# Altium footprint library WR-TBL_Pluggable PCB Header.PcbLib: 719 footprints (part 28 of 45)
Each footprint in its own frame and in the unit in brackets; x right, y up, seen from the top. Pads: shape width x height; smd on the part's side, far side on the other; paste and mask are expansions set on the pad; w line width, h text height; cw(c..) or ccw(c..) is an arc to the next point about the centre after c.
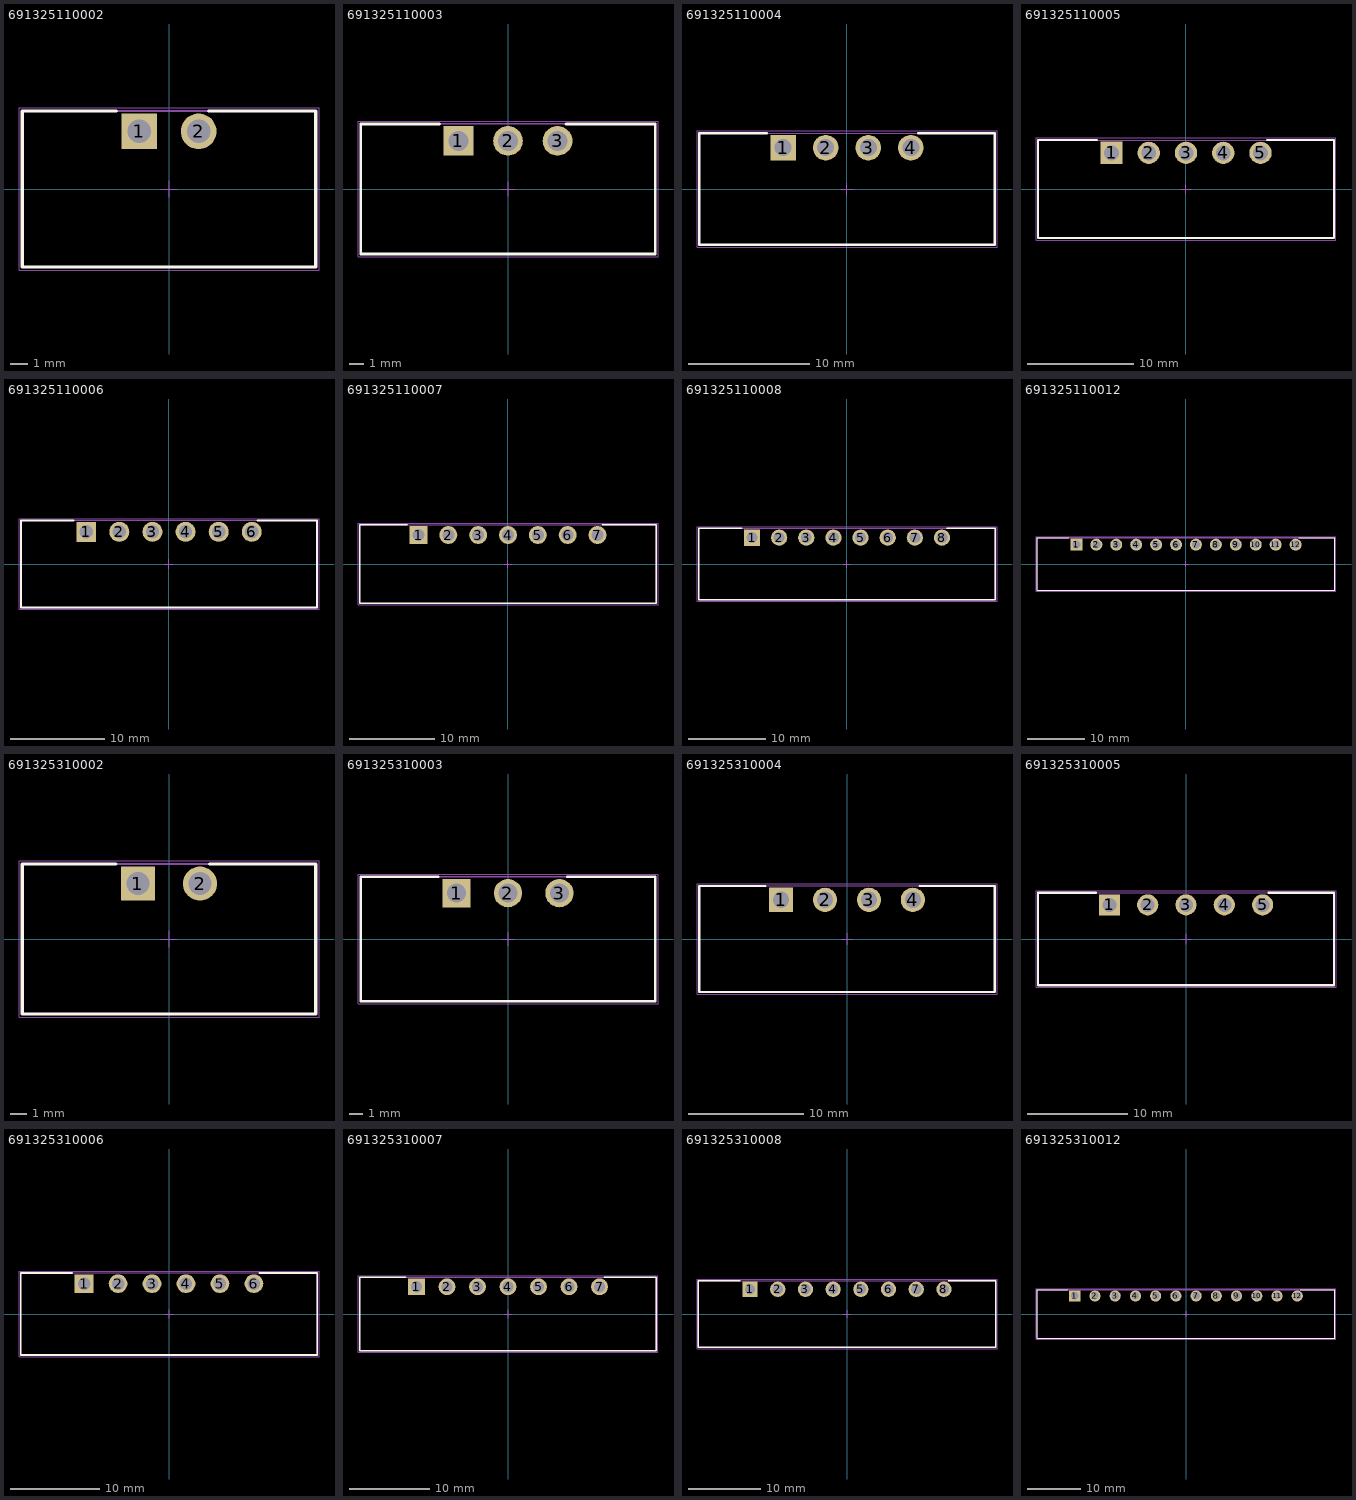
[diagram p27: the footprints below, top view; thin cyan lines are the x and y axes]

## 691325110002 [mm] "Horizontal PCB Header with Flanges, pitch 3.5mm, 02p"
height 7.2
pads (2):
  rect 2.1x2.1 hole 1.4: 1(-1.75,3.4)
  round 2.1 hole 1.4: 2(1.75,3.4)
Top Overlay:
  lines w0.2: -3.1,4.6 -8.65,4.6 -8.65,-4.6 8.65,-4.6 8.65,4.6 2.35,4.6
Mechanical 13:
  lines w0.1: -8.65,-4.6 -8.65,4.6 8.65,4.6 8.65,-4.6 -8.65,-4.6
Mechanical 15:
  lines w0.05: -0.5,0 0.5,0 ; 0,-0.5 0,0.5 ; -8.85,-4.8 8.85,-4.8 8.85,4.8 -8.85,4.8 -8.85,-4.8
3D body "691325110002.stp": height 7.3, standoff -3.5, extent -8.65,-4.6 8.65,4.6

## 691325110003 [mm] "Horizontal PCB Header with Flanges, pitch 3.5mm, 03p"
height 7.2
pads (3):
  rect 2.1x2.1 hole 1.4: 1(-3.5,3.4)
  round 2.1 hole 1.4: 2(0,3.4) 3(3.5,3.4)
Top Overlay:
  lines w0.2: -4.85,4.6 -10.4,4.6 -10.4,-4.6 10.4,-4.6 10.4,4.6 4.1,4.6
Mechanical 13:
  lines w0.1: -10.4,-4.6 -10.4,4.6 10.4,4.6 10.4,-4.6 -10.4,-4.6
Mechanical 15:
  lines w0.05: -0.5,0 0.5,0 ; 0,-0.5 0,0.5 ; -10.6,-4.8 10.6,-4.8 10.6,4.8 -10.6,4.8 -10.6,-4.8
3D body "691325110003.stp": height 7.3, standoff -3.5, extent -10.4,-4.6 10.4,4.6

## 691325110004 [mm] "Horizontal PCB Header with Flanges, pitch 3.5mm, 04p"
height 7.2
pads (4):
  rect 2.1x2.1 hole 1.4: 1(-5.25,3.4)
  round 2.1 hole 1.4: 2(-1.75,3.4) 3(1.75,3.4) 4(5.25,3.4)
Top Overlay:
  lines w0.2: -6.6,4.6 -12.15,4.6 -12.15,-4.6 12.15,-4.6 12.15,4.6 5.85,4.6
Mechanical 13:
  lines w0.1: -12.15,-4.6 -12.15,4.6 12.15,4.6 12.15,-4.6 -12.15,-4.6
Mechanical 15:
  lines w0.05: -0.5,0 0.5,0 ; 0,-0.5 0,0.5 ; -12.35,-4.8 12.35,-4.8 12.35,4.8 -12.35,4.8 -12.35,-4.8
3D body "691325110004.stp": height 7.3, standoff -3.5, extent -12.15,-4.6 12.15,4.6

## 691325110005 [mm] "Horizontal PCB Header with Flanges, pitch 3.5mm, 05p"
height 7.2
pads (5):
  rect 2.1x2.1 hole 1.4: 1(-7,3.4)
  round 2.1 hole 1.4: 2(-3.5,3.4) 3(0,3.4) 4(3.5,3.4) 5(7,3.4)
Top Overlay:
  lines w0.2: -8.35,4.6 -13.9,4.6 -13.9,-4.6 13.9,-4.6 13.9,4.6 7.6,4.6
Mechanical 13:
  lines w0.1: -13.9,-4.6 -13.9,4.6 13.9,4.6 13.9,-4.6 -13.9,-4.6
Mechanical 15:
  lines w0.05: -0.5,0 0.5,0 ; 0,-0.5 0,0.5 ; -14.1,-4.8 14.1,-4.8 14.1,4.8 -14.1,4.8 -14.1,-4.8
3D body "691325110005.stp": height 7.3, standoff -3.5, extent -13.9,-4.6 13.9,4.6

## 691325110006 [mm] "Horizontal PCB Header with Flanges, pitch 3.5mm, 06p"
height 7.2
pads (6):
  rect 2.1x2.1 hole 1.4: 1(-8.75,3.4)
  round 2.1 hole 1.4: 2(-5.25,3.4) 3(-1.75,3.4) 4(1.75,3.4) 5(5.25,3.4) 6(8.75,3.4)
Top Overlay:
  lines w0.2: -10.1,4.6 -15.65,4.6 -15.65,-4.6 15.65,-4.6 15.65,4.6 9.35,4.6
Mechanical 13:
  lines w0.1: -15.65,-4.6 15.65,-4.6 15.65,4.6 -15.65,4.6 -15.65,-4.6
Mechanical 15:
  lines w0.05: -0.5,0 0.5,0 ; 0,-0.5 0,0.5 ; -15.85,-4.8 -15.85,4.8 15.85,4.8 15.85,-4.8 -15.85,-4.8
3D body "691325110006.stp": height 7.3, standoff -3.5, extent -15.65,-4.6 15.65,4.6

## 691325110007 [mm] "Horizontal PCB Header with Flanges, pitch 3.5mm, 07p"
height 7.2
pads (7):
  rect 2.1x2.1 hole 1.4: 1(-10.5,3.4)
  round 2.1 hole 1.4: 2(-7,3.4) 3(-3.5,3.4) 4(0,3.4) 5(3.5,3.4) 6(7,3.4) 7(10.5,3.4)
Top Overlay:
  lines w0.2: -11.85,4.6 -17.4,4.6 -17.4,-4.6 17.4,-4.6 17.4,4.6 11.1,4.6
Mechanical 13:
  lines w0.1: -17.4,-4.6 17.4,-4.6 17.4,4.6 -17.4,4.6 -17.4,-4.6
Mechanical 15:
  lines w0.05: -0.5,0 0.5,0 ; 0,-0.5 0,0.5 ; -17.6,-4.8 -17.6,4.8 17.6,4.8 17.6,-4.8 -17.6,-4.8
3D body "691325110007.stp": height 7.3, standoff -3.4, extent -17.4,-4.6 17.4,4.6

## 691325110008 [mm] "Horizontal PCB Header with Flanges, pitch 3.5mm, 08p"
height 7.2
pads (8):
  rect 2.1x2.1 hole 1.4: 1(-12.25,3.4)
  round 2.1 hole 1.4: 2(-8.75,3.4) 3(-5.25,3.4) 4(-1.75,3.4) 5(1.75,3.4) 6(5.25,3.4) 7(8.75,3.4) 8(12.25,3.4)
Top Overlay:
  lines w0.2: -13.6,4.6 -19.15,4.6 -19.15,-4.6 19.15,-4.6 19.15,4.6 12.85,4.6
Mechanical 13:
  lines w0.1: -19.15,-4.6 -19.15,4.6 19.15,4.6 19.15,-4.6 -19.15,-4.6
Mechanical 15:
  lines w0.05: -0.5,0 0.5,0 ; 0,-0.5 0,0.5 ; -19.35,-4.8 19.35,-4.8 19.35,4.8 -19.35,4.8 -19.35,-4.8
3D body "691325110008.stp": height 7.3, standoff -3.4, extent -19.15,-4.6 19.15,4.6

## 691325110012 [mm] "Horizontal PCB Header with Flanges, pitch 3.5mm, 12p"
height 7.2
pads (12):
  rect 2.1x2.1 hole 1.4: 1(-19.25,3.4)
  round 2.1 hole 1.4: 2(-15.75,3.4) 3(-12.25,3.4) 4(-8.75,3.4) 5(-5.25,3.4) 6(-1.75,3.4) 7(1.75,3.4) 8(5.25,3.4) 9(8.75,3.4) 10(12.25,3.4) 11(15.75,3.4) 12(19.25,3.4)
Top Overlay:
  lines w0.2: -20.6,4.6 -26.15,4.6 -26.15,-4.6 26.15,-4.6 26.15,4.6 19.85,4.6
Mechanical 13:
  lines w0.1: -26.15,-4.6 -26.15,4.6 26.15,4.6 26.15,-4.6 -26.15,-4.6
Mechanical 15:
  lines w0.05: -0.5,0 0.5,0 ; 0,-0.5 0,0.5 ; -26.35,-4.8 26.35,-4.8 26.35,4.8 -26.35,4.8 -26.35,-4.8
3D body "691325110012.stp": height 7.3, standoff -3.4, extent -26.15,-4.6 26.15,4.6

## 691325310002 [mm] "Horizontal PCB Header with Flanges, pitch 3.81mm, 02p"
height 7
pads (2):
  rect 2.1x2.1 hole 1.4: 1(-1.905,3.4)
  round 2.1 hole 1.4: 2(1.905,3.4)
Top Overlay:
  lines w0.2: -3.255,4.6 -9.005,4.6 -9.005,-4.6 9.005,-4.6 9.005,4.6 2.495,4.6
Mechanical 13:
  lines w0.1: -9.005,-4.6 -9.005,4.6 9.005,4.6 9.005,-4.6 -9.005,-4.6
Mechanical 15:
  lines w0.05: -0.5,0 0.5,0 ; 0,-0.5 0,0.5 ; -9.205,-4.8 9.205,-4.8 9.205,4.8 -9.205,4.8 -9.205,-4.8
3D body "691325310002.stp": height 7.3, standoff -3.4, extent -9.005,-4.6 9.005,4.6

## 691325310003 [mm] "Horizontal PCB Header with Flanges, pitch 3.81mm, 03p"
height 7
pads (3):
  rect 2.1x2.1 hole 1.4: 1(-3.81,3.4)
  round 2.1 hole 1.4: 2(0,3.4) 3(3.81,3.4)
Top Overlay:
  lines w0.2: -5.16,4.6 -10.91,4.6 -10.91,-4.6 10.91,-4.6 10.91,4.6 4.4,4.6
Mechanical 13:
  lines w0.1: -10.91,-4.6 -10.91,4.6 10.91,4.6 10.91,-4.6 -10.91,-4.6
Mechanical 15:
  lines w0.05: -0.5,0 0.5,0 ; 0,-0.5 0,0.5 ; -11.11,-4.8 11.11,-4.8 11.11,4.8 -11.11,4.8 -11.11,-4.8
3D body "691325310003.stp": height 7.3, standoff -3.4, extent -10.91,-4.6 10.91,4.6

## 691325310004 [mm] "Horizontal PCB Header with Flanges, pitch 3.81mm, 04p"
height 7
pads (4):
  rect 2.1x2.1 hole 1.4: 1(-5.715,3.4)
  round 2.1 hole 1.4: 2(-1.905,3.4) 3(1.905,3.4) 4(5.715,3.4)
Top Overlay:
  lines w0.2: -7.065,4.6 -12.815,4.6 -12.815,-4.6 12.815,-4.6 12.815,4.6 6.305,4.6
Mechanical 13:
  lines w0.1: -12.815,-4.6 -12.815,4.6 12.815,4.6 12.815,-4.6 -12.815,-4.6
Mechanical 15:
  lines w0.05: -0.5,0 0.5,0 ; 0,-0.5 0,0.5 ; -13.015,-4.8 13.015,-4.8 13.015,4.8 -13.015,4.8 -13.015,-4.8
3D body "691325310004.stp": height 7.3, standoff -3.4, extent -12.815,-4.6 12.815,4.6

## 691325310005 [mm] "Horizontal PCB Header with Flanges, pitch 3.81mm, 05p"
height 7
pads (5):
  rect 2.1x2.1 hole 1.4: 1(-7.62,3.4)
  round 2.1 hole 1.4: 2(-3.81,3.4) 3(0,3.4) 4(3.81,3.4) 5(7.62,3.4)
Top Overlay:
  lines w0.2: -8.97,4.6 -14.72,4.6 -14.72,-4.6 14.72,-4.6 14.72,4.6 8.21,4.6
Mechanical 13:
  lines w0.1: -14.72,-4.6 14.72,-4.6 14.72,4.6 -14.72,4.6 -14.72,-4.6
Mechanical 15:
  lines w0.05: -0.5,0 0.5,0 ; 0,-0.5 0,0.5 ; -14.92,-4.8 -14.92,4.8 14.92,4.8 14.92,-4.8 -14.92,-4.8
3D body "691325310005.stp": height 7.3, standoff -3.4, extent -14.72,-4.6 14.72,4.6

## 691325310006 [mm] "Horizontal PCB Header with Flanges, pitch 3.81mm, 06p"
height 7
pads (6):
  rect 2.1x2.1 hole 1.4: 1(-9.525,3.4)
  round 2.1 hole 1.4: 2(-5.715,3.4) 3(-1.905,3.4) 4(1.905,3.4) 5(5.715,3.4) 6(9.525,3.4)
Top Overlay:
  lines w0.2: -10.875,4.6 -16.625,4.6 -16.625,-4.6 16.625,-4.6 16.625,4.6 10.115,4.6
Mechanical 13:
  lines w0.1: -16.625,-4.6 16.625,-4.6 16.625,4.6 -16.625,4.6 -16.625,-4.6
Mechanical 15:
  lines w0.05: -0.5,0 0.5,0 ; 0,-0.5 0,0.5 ; -16.825,-4.8 -16.825,4.8 16.825,4.8 16.825,-4.8 -16.825,-4.8
3D body "691325310006.stp": height 7.3, standoff -3.4, extent -16.625,-4.6 16.625,4.6

## 691325310007 [mm] "Horizontal PCB Header with Flanges, pitch 3.81mm, 07p"
height 7
pads (7):
  rect 2.1x2.1 hole 1.4: 1(-11.43,3.4)
  round 2.1 hole 1.4: 2(-7.62,3.4) 3(-3.81,3.4) 4(0,3.4) 5(3.81,3.4) 6(7.62,3.4) 7(11.43,3.4)
Top Overlay:
  lines w0.2: -12.78,4.6 -18.53,4.6 -18.53,-4.6 18.53,-4.6 18.53,4.6 12.02,4.6
Mechanical 13:
  lines w0.1: -18.53,-4.6 18.53,-4.6 18.53,4.6 -18.53,4.6 -18.53,-4.6
Mechanical 15:
  lines w0.05: -0.5,0 0.5,0 ; 0,-0.5 0,0.5 ; -18.73,-4.8 -18.73,4.8 18.73,4.8 18.73,-4.8 -18.73,-4.8
3D body "691325310007.stp": height 7.3, standoff -3.4, extent -18.53,-4.6 18.53,4.6

## 691325310008 [mm] "Horizontal PCB Header with Flanges, pitch 3.81mm, 08p"
height 7
pads (8):
  rect 2.1x2.1 hole 1.4: 1(-13.335,3.4)
  round 2.1 hole 1.4: 2(-9.525,3.4) 3(-5.715,3.4) 4(-1.905,3.4) 5(1.905,3.4) 6(5.715,3.4) 7(9.525,3.4) 8(13.335,3.4)
Top Overlay:
  lines w0.2: -14.685,4.6 -20.435,4.6 -20.435,-4.6 20.435,-4.6 20.435,4.6 13.925,4.6
Mechanical 13:
  lines w0.1: -20.435,-4.6 20.435,-4.6 20.435,4.6 -20.435,4.6 -20.435,-4.6
Mechanical 15:
  lines w0.05: -0.5,0 0.5,0 ; 0,-0.5 0,0.5 ; -20.635,-4.8 -20.635,4.8 20.635,4.8 20.635,-4.8 -20.635,-4.8
3D body "691325310008.stp": height 7.3, standoff -3.4, extent -20.435,-4.6 20.435,4.6

## 691325310012 [mm] "Horizontal PCB Header with Flanges, pitch 3.81mm, 12p"
height 7
pads (12):
  rect 2.1x2.1 hole 1.4: 1(-20.955,3.4)
  round 2.1 hole 1.4: 2(-17.145,3.4) 3(-13.335,3.4) 4(-9.525,3.4) 5(-5.715,3.4) 6(-1.905,3.4) 7(1.905,3.4) 8(5.715,3.4) 9(9.525,3.4) 10(13.335,3.4) 11(17.145,3.4) 12(20.955,3.4)
Top Overlay:
  lines w0.2: -22.305,4.6 -28.055,4.6 -28.055,-4.6 28.055,-4.6 28.055,4.6 21.545,4.6
Mechanical 13:
  lines w0.1: -28.055,-4.6 -28.055,4.6 28.055,4.6 28.055,-4.6 -28.055,-4.6
Mechanical 15:
  lines w0.05: -0.5,0 0.5,0 ; 0,-0.5 0,0.5 ; -28.255,-4.8 28.255,-4.8 28.255,4.8 -28.255,4.8 -28.255,-4.8
3D body "691325310012.stp": height 7.3, standoff -3.4, extent -28.055,-4.6 28.055,4.6